# Altium footprint library SMD Passive.PcbLib: 136 footprints (part 7 of 9)
Each footprint in its own frame and in the unit in brackets; x right, y up, seen from the top. Pads: shape width x height; smd on the part's side, far side on the other; paste and mask are expansions set on the pad; w line width, h text height; cw(c..) or ccw(c..) is an arc to the next point about the centre after c.
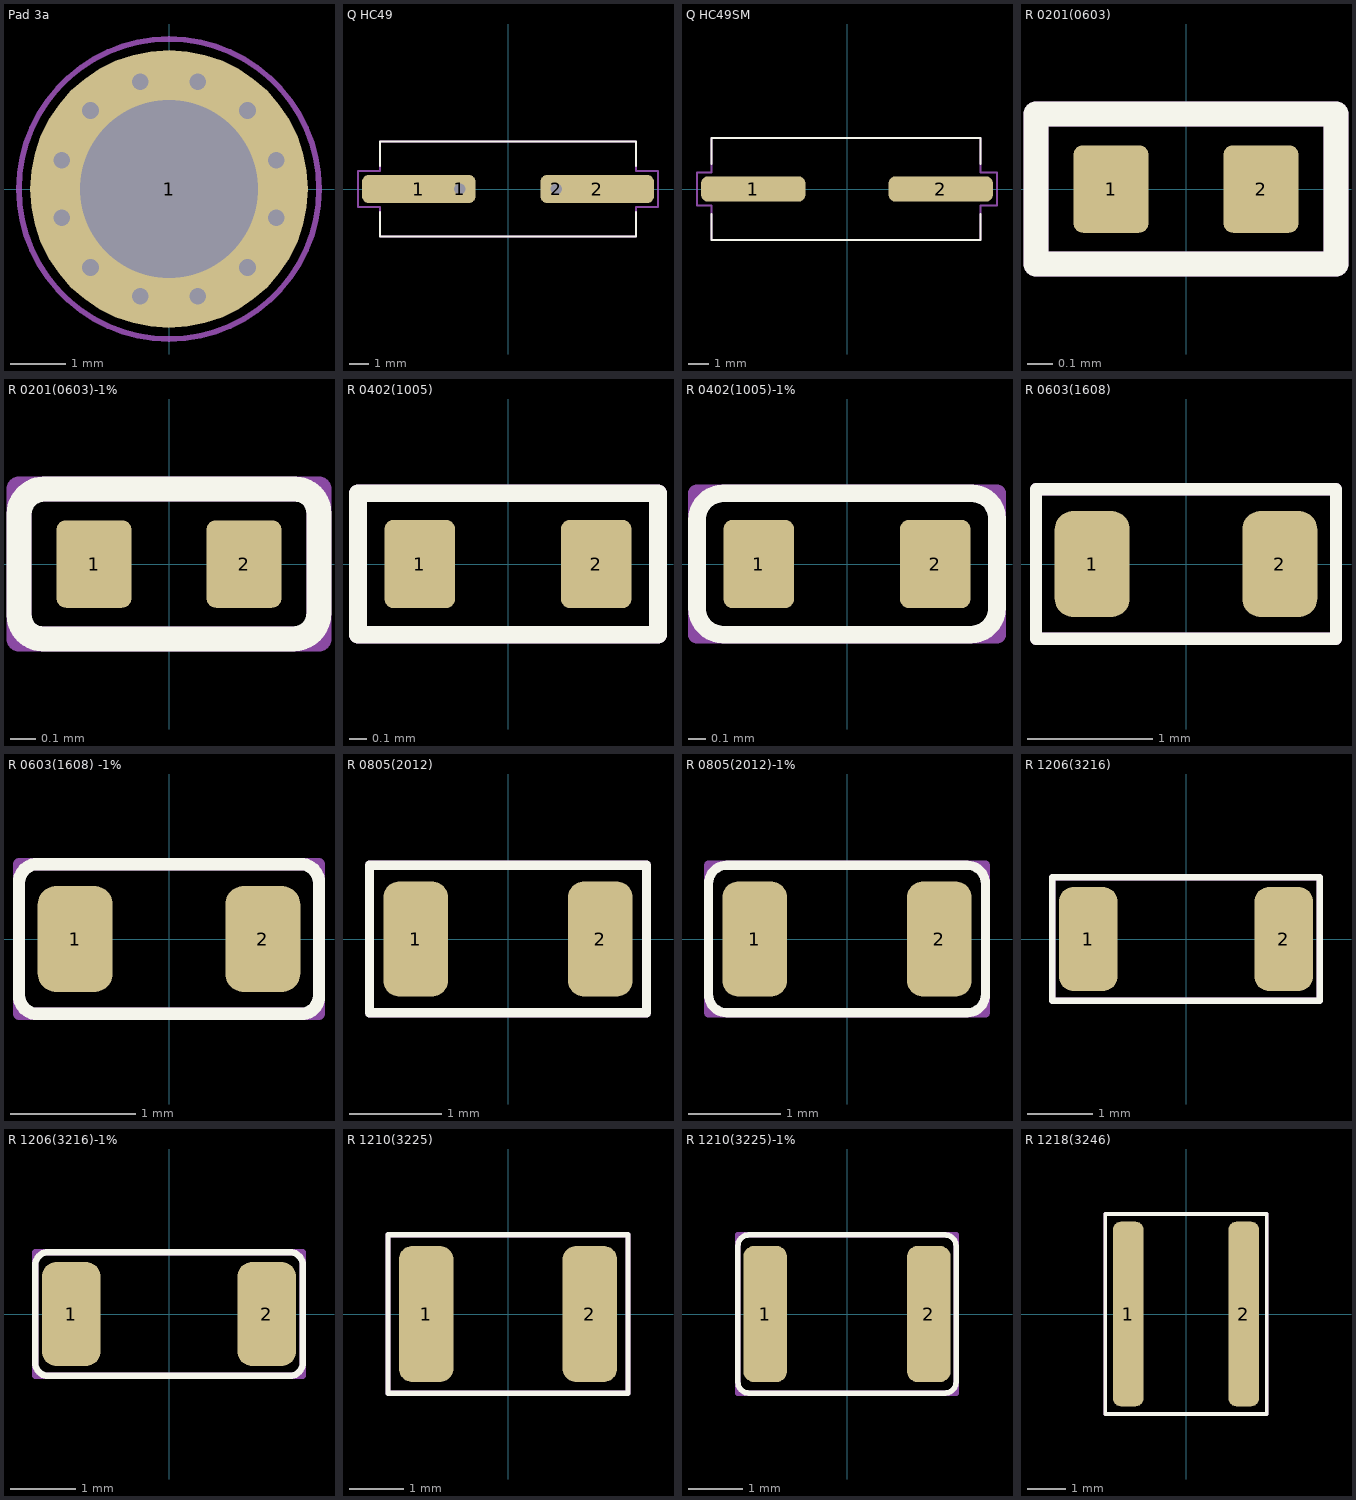
[diagram p6: the footprints below, top view; thin cyan lines are the x and y axes]

## Pad 3a [mm]
pads (1):
  round 5 hole 3.2 paste-2539.97: 1(0,0)
via -1.932,-0.518 diameter 0.7 hole 0.3
via -1.414,-1.414 diameter 0.7 hole 0.3
via -0.518,-1.932 diameter 0.7 hole 0.3
via 0.518,-1.932 diameter 0.7 hole 0.3
via 1.414,-1.414 diameter 0.7 hole 0.3
via 1.932,-0.518 diameter 0.7 hole 0.3
via 1.932,0.518 diameter 0.7 hole 0.3
via 1.414,1.414 diameter 0.7 hole 0.3
via 0.518,1.932 diameter 0.7 hole 0.3
via -0.518,1.932 diameter 0.7 hole 0.3
via -1.414,1.414 diameter 0.7 hole 0.3
via -1.932,0.518 diameter 0.7 hole 0.3
Top Courtyard:
  circle w0.1: c0,0 r2.7

## Q HC49 [mm]
pads (4):
  rrect50% 6x1.5 smd: 1(-4.699,0) 2(4.699,0)
  rrect50% 1.2x1.2 hole 0.6: 1(-2.54,0) 2(2.54,0)
Top Overlay:
  lines w0.1: -6.75,-1.206 -6.75,-2.5 6.75,-2.5 6.75,-1.206 ; -6.75,1.206 -6.75,2.5 6.75,2.5 6.75,1.206
Top Courtyard:
  lines w0.1: -7.9,-0.95 -6.75,-0.95 -6.75,-2.5 6.75,-2.5 6.75,-0.95 7.9,-0.95 7.9,0.95 6.75,0.95 6.75,2.5 -6.75,2.5 -6.75,0.95 -7.9,0.95 -7.9,-0.95
3D body "SMD Q HC49.STEP": height 5.08, standoff 0, extent -6.7,-2.45 6.7,2.45

## Q HC49SM [mm]
pads (2):
  rrect50% 5x1.2 smd: 1(-4.5,0) 2(4.5,0)
Top Overlay:
  lines w0.1: -6.5,-1.206 -6.5,-2.45 6.4,-2.45 6.4,-1.206 ; -6.5,1.206 -6.5,2.45 6.4,2.45 6.4,1.206
Top Courtyard:
  lines w0.1: -7.2,-0.8 -6.5,-0.8 -6.5,-2.45 6.4,-2.45 6.4,-0.8 7.2,-0.8 7.2,0.8 6.4,0.8 6.4,2.45 -6.5,2.45 -6.5,0.8 -7.2,0.8 -7.2,-0.8
3D body "HC49 US-SM.STEP": height 4.3, standoff 0, extent -6.45,-2.415 6.35,2.415

## R 0201(0603) [mm]
height 0.35
pads (2):
  rrect25% 0.3x0.35 smd paste-0.1 mask+0.102: 1(-0.3,0) 2(0.3,0)
Top Overlay:
  lines w0.1: -0.6,-0.3 -0.6,0.3 0.6,0.3 0.6,-0.3 -0.6,-0.3
Top Paste:
  region: 0.285,0.135 0.315,0.135 0.339,0.135 0.383,0.117 0.417,0.083 0.435,0.039 0.435,0.015 0.435,-0.015 0.435,-0.039 0.417,-0.083 0.383,-0.117 0.339,-0.135 0.315,-0.135 0.285,-0.135 0.261,-0.135 0.217,-0.117 0.183,-0.083 0.165,-0.039 0.165,-0.015 0.165,0.015 0.165,0.039 0.183,0.083 0.217,0.117 0.261,0.135
  region: -0.285,0.135 -0.315,0.135 -0.339,0.135 -0.383,0.117 -0.417,0.083 -0.435,0.039 -0.435,0.015 -0.435,-0.015 -0.435,-0.039 -0.417,-0.083 -0.383,-0.117 -0.339,-0.135 -0.315,-0.135 -0.285,-0.135 -0.261,-0.135 -0.217,-0.117 -0.183,-0.083 -0.165,-0.039 -0.165,-0.015 -0.165,0.015 -0.165,0.039 -0.183,0.083 -0.217,0.117 -0.261,0.135
Top Solder:
  region: -0.425,0.25 0.425,0.25 0.45,0.25 0.496,0.231 0.531,0.196 0.55,0.15 0.55,0.125 0.55,-0.125 0.55,-0.15 0.531,-0.196 0.496,-0.231 0.45,-0.25 0.425,-0.25 -0.425,-0.25 -0.45,-0.25 -0.496,-0.231 -0.531,-0.196 -0.55,-0.15 -0.55,-0.125 -0.55,0.125 -0.55,0.15 -0.531,0.196 -0.496,0.231 -0.45,0.25
Top Courtyard:
  lines w0.1: -0.6,-0.3 -0.6,0.3 0.6,0.3 0.6,-0.3 -0.6,-0.3
3D body "SMD R-0201.STEP": height 0.34, standoff 0, extent -0.34,-0.165 0.34,0.165

## R 0201(0603)-1% [mm]
height 0.35
pads (2):
  rrect25% 0.3x0.35 smd paste-0.1 mask+0.102: 1(-0.3,0) 2(0.3,0)
Top Overlay:
  lines w0.1: -0.6,-0.202 ccw(c-0.502,-0.202) -0.502,-0.3 0.496,-0.3 ccw(c0.496,-0.196) 0.6,-0.196 0.6,0.202 ccw(c0.502,0.202) 0.502,0.3 -0.499,0.3 ccw(c-0.499,0.199) -0.6,0.199 -0.6,-0.202
Top Paste:
  region: 0.285,0.135 0.315,0.135 0.339,0.135 0.383,0.117 0.417,0.083 0.435,0.039 0.435,0.015 0.435,-0.015 0.435,-0.039 0.417,-0.083 0.383,-0.117 0.339,-0.135 0.315,-0.135 0.285,-0.135 0.261,-0.135 0.217,-0.117 0.183,-0.083 0.165,-0.039 0.165,-0.015 0.165,0.015 0.165,0.039 0.183,0.083 0.217,0.117 0.261,0.135
  region: -0.285,0.135 -0.315,0.135 -0.339,0.135 -0.383,0.117 -0.417,0.083 -0.435,0.039 -0.435,0.015 -0.435,-0.015 -0.435,-0.039 -0.417,-0.083 -0.383,-0.117 -0.339,-0.135 -0.315,-0.135 -0.285,-0.135 -0.261,-0.135 -0.217,-0.117 -0.183,-0.083 -0.165,-0.039 -0.165,-0.015 -0.165,0.015 -0.165,0.039 -0.183,0.083 -0.217,0.117 -0.261,0.135
Top Solder:
  region: -0.425,0.25 0.425,0.25 0.45,0.25 0.496,0.231 0.531,0.196 0.55,0.15 0.55,0.125 0.55,-0.125 0.55,-0.15 0.531,-0.196 0.496,-0.231 0.45,-0.25 0.425,-0.25 -0.425,-0.25 -0.45,-0.25 -0.496,-0.231 -0.531,-0.196 -0.55,-0.15 -0.55,-0.125 -0.55,0.125 -0.55,0.15 -0.531,0.196 -0.496,0.231 -0.45,0.25
Top Courtyard:
  lines w0.1: -0.6,-0.3 0.6,-0.3 0.6,0.3 -0.6,0.3 -0.6,-0.3
3D body "SMD R-0201-1%.STEP": height 0.34, standoff 0, extent -0.34,-0.165 0.34,0.165

## R 0402(1005) [mm]
height 0.35
pads (2):
  rrect25% 0.4x0.5 smd mask+0.102: 1(-0.5,0) 2(0.5,0)
Top Overlay:
  lines w0.1: -0.85,-0.4 0.85,-0.4 0.85,0.4 -0.85,0.4 -0.85,-0.4
Top Courtyard:
  lines w0.1: -0.85,-0.4 -0.85,0.4 0.85,0.4 0.85,-0.4 -0.85,-0.4
3D body "SMD R-0402.STEP": height 0.35, standoff 0, extent -0.5,-0.25 0.5,0.25

## R 0402(1005)-1% [mm]
height 0.35
pads (2):
  rrect25% 0.4x0.5 smd mask+0.102: 1(-0.5,0) 2(0.5,0)
Top Overlay:
  lines w0.1: -0.85,-0.25 ccw(c-0.7,-0.25) -0.7,-0.4 0.7,-0.4 ccw(c0.7,-0.25) 0.85,-0.25 0.85,0.258 ccw(c0.708,0.258) 0.708,0.4 -0.7,0.4 ccw(c-0.7,0.25) -0.85,0.25 -0.85,-0.25
Top Courtyard:
  lines w0.1: -0.85,-0.4 -0.85,0.4 0.85,0.4 0.85,-0.4 -0.85,-0.4
3D body "SMD R-0402-1%.STEP": height 0.19, standoff -0.18, extent -0.5,-0.25 0.5,0.25

## R 0603(1608) [mm]
height 0.45
pads (2):
  rrect50% 0.6x0.85 smd: 1(-0.75,0) 2(0.75,0)
Top Overlay:
  lines w0.1: -1.2,-0.6 1.2,-0.6 1.2,0.6 -1.2,0.6 -1.2,-0.6
Top Courtyard:
  lines w0.1: -1.2,-0.6 -1.2,0.6 1.2,0.6 1.2,-0.6 -1.2,-0.6
3D body "SMD R-0603.STEP": height 0.45, standoff -0.01, extent -0.8,-0.4 0.8,0.4

## R 0603(1608) -1% [mm]
height 0.45
pads (2):
  rrect50% 0.6x0.85 smd: 1(-0.75,0) 2(0.75,0)
Top Overlay:
  lines w0.1: -1.2,-0.45 ccw(c-1.05,-0.45) -1.05,-0.6 1.055,-0.6 ccw(c1.055,-0.455) 1.2,-0.455 1.2,0.45 ccw(c1.05,0.45) 1.05,0.6 -1.05,0.6 ccw(c-1.05,0.45) -1.2,0.45 -1.2,-0.45
Top Courtyard:
  lines w0.1: -1.2,-0.6 1.2,-0.6 1.2,0.6 -1.2,0.6 -1.2,-0.6
3D body "SMD R-0603-1%.STEP": height 0.45, standoff -0.01, extent -0.8,-0.4 0.8,0.4

## R 0805(2012) [mm]
height 0.55
pads (2):
  rrect50% 0.7x1.25 smd: 1(-1,0) 2(1,0)
Top Overlay:
  lines w0.1: -1.5,-0.8 -1.5,0.8 1.5,0.8 1.5,-0.8 -1.5,-0.8
Top Courtyard:
  lines w0.1: -1.5,-0.8 1.5,-0.8 1.5,0.8 -1.5,0.8 -1.5,-0.8
3D body "SMD R-0805.STEP": height 0.6, standoff 0, extent -1,-0.625 1,0.625

## R 0805(2012)-1% [mm]
height 0.55
pads (2):
  rrect50% 0.7x1.25 smd: 1(-1,0) 2(1,0)
Top Overlay:
  lines w0.1: -1.5,-0.6 ccw(c-1.3,-0.6) -1.3,-0.8 1.3,-0.8 ccw(c1.3,-0.6) 1.5,-0.6 1.5,0.6 ccw(c1.3,0.6) 1.3,0.8 -1.3,0.8 ccw(c-1.3,0.6) -1.5,0.6 -1.5,-0.6
Top Courtyard:
  lines w0.1: -1.5,-0.8 1.5,-0.8 1.5,0.8 -1.5,0.8 -1.5,-0.8
3D body "SMD R-0805-1%.STEP": height 0.6, standoff 0, extent -1,-0.625 1,0.625

## R 1206(3216) [mm]
height 0.55
pads (2):
  rrect50% 0.9x1.6 smd mask+0.102: 1(-1.5,0) 2(1.5,0)
Top Overlay:
  lines w0.1: -2.05,-0.95 2.05,-0.95 2.05,0.95 -2.05,0.95 -2.05,-0.95
Top Courtyard:
  lines w0.1: -2.05,-0.95 2.05,-0.95 2.05,0.95 -2.05,0.95 -2.05,-0.95
3D body "SMD R-1206.STEP": height 0.6, standoff 0, extent -1.6,-0.8 1.6,0.8

## R 1206(3216)-1% [mm]
height 0.55
pads (2):
  rrect50% 0.9x1.6 smd mask+0.102: 1(-1.5,0) 2(1.5,0)
Top Overlay:
  lines w0.1: -2.05,-0.748 ccw(c-1.848,-0.748) -1.848,-0.95 1.85,-0.95 ccw(c1.85,-0.75) 2.05,-0.75 2.05,0.752 ccw(c1.852,0.752) 1.852,0.95 -1.85,0.95 ccw(c-1.85,0.75) -2.05,0.75 -2.05,-0.748
Top Courtyard:
  lines w0.1: -2.05,-0.95 2.05,-0.95 2.05,0.95 -2.05,0.95 -2.05,-0.95
3D body "SMD R-1206-1%.STEP": height 0.6, standoff 0, extent -1.6,-0.8 1.6,0.8

## R 1210(3225) [mm]
height 0.55
pads (2):
  rrect50% 1x2.5 smd: 1(-1.5,0) 2(1.5,0)
Top Overlay:
  lines w0.1: -2.2,-1.45 2.2,-1.45 2.2,1.45 -2.2,1.45 -2.2,-1.45
Top Courtyard:
  lines w0.1: -2.2,-1.45 2.2,-1.45 2.2,1.45 -2.2,1.45 -2.2,-1.45
3D body "SMD R-1210.STEP": height 0.9, standoff 0.3, extent -1.6,-1.25 1.6,1.25

## R 1210(3225)-1% [mm]
height 0.55
pads (2):
  rrect50% 0.8x2.5 smd: 1(-1.5,0) 2(1.5,0)
Top Overlay:
  lines w0.1: -2,-1.25 ccw(c-1.8,-1.25) -1.8,-1.45 1.799,-1.45 ccw(c1.799,-1.249) 2,-1.249 2,1.249 ccw(c1.799,1.249) 1.799,1.45 -1.8,1.45 ccw(c-1.8,1.25) -2,1.25 -2,-1.25
Top Courtyard:
  lines w0.1: -2,-1.45 2,-1.45 2,1.45 -2,1.45 -2,-1.45
3D body "SMD R-1210-1%.STEP": height 0.6, standoff 0, extent -1.6,-1.25 1.6,1.25

## R 1218(3246) [mm]
height 0.55
pads (2):
  rrect50% 0.8x4.8 smd: 1(-1.5,0) 2(1.5,0)
Top Overlay:
  lines w0.1: -2.1,-2.6 2.1,-2.6 2.1,2.6 -2.1,2.6 -2.1,-2.6
Top Courtyard:
  lines w0.1: -2.1,-2.6 2.1,-2.6 2.1,2.6 -2.1,2.6 -2.1,-2.6
3D body "SMD R-1218.STEP": height 0.85, standoff 0.3, extent -1.6,-2.3 1.6,2.3